# Altium schematic symbol library Regulator_Linear.SchLib: 1452 symbols (part 7 of 10) (continued)
## MIC5366-3.3YC5
designator *  value MIC5366-3.3YC5
ki_keywords: Micrel LDO voltage regulator; ki_description: 150mA Low-dropout Voltage Regulator, Vout 3.3V, Output discharge circuit, Vin up to 5.5V, SC-70-5; ki_fp_filters: SOT*353*SC*70*; Footprint: Package_TO_SOT_SMD:SOT-353_SC-70-5; Supplier: http://ww1.microchip.com/downloads/en/DeviceDoc/mic5365.pdf
footprint SOT-353_SC-70-5
pins: 1 VIN (power), 2 GND (power), 3 EN (in), 4 NC (in) hidden, 5 VOUT (power)

## MIC5501-3.0YM5
designator *  value MIC5501-3.0YM5
ki_keywords: Micrel LDO voltage regulator; ki_description: 300mA Low-dropout Voltage Regulator, Vout 3.0V, Vin up to 5.5V, SOT-23; ki_fp_filters: SOT?23?5*; Footprint: Package_TO_SOT_SMD:SOT-23-5; Supplier: http://ww1.microchip.com/downloads/en/DeviceDoc/MIC550X.pdf
footprint SOT-23-5
pins: 1 VIN (power), 2 GND (power), 3 EN (in), 4 NC (in) hidden, 5 VOUT (power)

## MIC5504-1.2YM5
designator *  value MIC5504-1.2YM5
ki_keywords: Micrel LDO voltage regulator; ki_description: 300mA Low-dropout Voltage Regulator, Vout 1.2V, Vin up to 5.5V, SOT-23; ki_fp_filters: SOT?23?5*; Footprint: Package_TO_SOT_SMD:SOT-23-5; Supplier: http://ww1.microchip.com/downloads/en/DeviceDoc/MIC550X.pdf
footprint SOT-23-5
pins: 1 VIN (power), 2 GND (power), 3 EN (in), 4 NC (in) hidden, 5 VOUT (power)

## MIC5504-1.8YM5
designator *  value MIC5504-1.8YM5
ki_keywords: Micrel LDO voltage regulator; ki_description: 300mA Low-dropout Voltage Regulator, Vout 1.8V, Vin up to 5.5V, SOT-23; ki_fp_filters: SOT?23?5*; Footprint: Package_TO_SOT_SMD:SOT-23-5; Supplier: http://ww1.microchip.com/downloads/en/DeviceDoc/MIC550X.pdf
footprint SOT-23-5
pins: 1 VIN (power), 2 GND (power), 3 EN (in), 4 NC (in) hidden, 5 VOUT (power)

## MIC5504-2.5YM5
designator *  value MIC5504-2.5YM5
ki_keywords: Micrel LDO voltage regulator; ki_description: 300mA Low-dropout Voltage Regulator, Vout 2.5V, Vin up to 5.5V, SOT-23; ki_fp_filters: SOT?23?5*; Footprint: Package_TO_SOT_SMD:SOT-23-5; Supplier: http://ww1.microchip.com/downloads/en/DeviceDoc/MIC550X.pdf
footprint SOT-23-5
pins: 1 VIN (power), 2 GND (power), 3 EN (in), 4 NC (in) hidden, 5 VOUT (power)

## MIC5504-2.8YM5
designator *  value MIC5504-2.8YM5
ki_keywords: Micrel LDO voltage regulator; ki_description: 300mA Low-dropout Voltage Regulator, Vout 2.8V, Vin up to 5.5V, SOT-23; ki_fp_filters: SOT?23?5*; Footprint: Package_TO_SOT_SMD:SOT-23-5; Supplier: http://ww1.microchip.com/downloads/en/DeviceDoc/MIC550X.pdf
footprint SOT-23-5
pins: 1 VIN (power), 2 GND (power), 3 EN (in), 4 NC (in) hidden, 5 VOUT (power)

## MIC5504-3.3YM5
designator *  value MIC5504-3.3YM5
ki_keywords: Micrel LDO voltage regulator; ki_description: 300mA Low-dropout Voltage Regulator, Vout 3.3V, Vin up to 5.5V, SOT-23; ki_fp_filters: SOT?23?5*; Footprint: Package_TO_SOT_SMD:SOT-23-5; Supplier: http://ww1.microchip.com/downloads/en/DeviceDoc/MIC550X.pdf
footprint SOT-23-5
pins: 1 VIN (power), 2 GND (power), 3 EN (in), 4 NC (in) hidden, 5 VOUT (power)

## MIC29152WT
designator *  value MIC29152WT
ki_keywords: 1.5A LDO linear voltage regulator adjustable positive; ki_description: 1.5A low dropout linear regulator, adjustable output, TO-220; ki_fp_filters: TO*220*; Footprint: Package_TO_SOT_THT:TO-220-5_P3.4x3.7mm_StaggerEven_Lead3.8mm_Vertical; Supplier: http://ww1.microchip.com/downloads/en/devicedoc/20005685a.pdf
footprint TO-220-5_P3.4x3.7mm_StaggerEven_Lead3.8mm_Vertical
pins: 1 EN (in), 2 VIN (power), 3 GND (power), 4 VOUT (power), 5 ADJ (in)

## MIC29152WU
designator *  value MIC29152WU
ki_keywords: 1.5A LDO linear voltage regulator adjustable positive; ki_description: 1.5A low dropout linear regulator, adjustable output, TO-252; ki_fp_filters: TO*252*; Footprint: Package_TO_SOT_SMD:TO-252-5_TabPin3; Supplier: http://ww1.microchip.com/downloads/en/devicedoc/20005685a.pdf
footprint TO-252-5_TabPin3
pins: 1 EN (in), 2 VIN (power), 3 GND (power), 4 VOUT (power), 5 ADJ (in)

## MIC29153WT
designator *  value MIC29153WT
ki_keywords: 1.5A LDO linear voltage regulator adjustable positive; ki_description: 1.5A low dropout linear regulator, adjustable output, TO-220; ki_fp_filters: TO*220*; Footprint: Package_TO_SOT_THT:TO-220-5_P3.4x3.7mm_StaggerEven_Lead3.8mm_Vertical; Supplier: http://ww1.microchip.com/downloads/en/devicedoc/20005685a.pdf
footprint TO-220-5_P3.4x3.7mm_StaggerEven_Lead3.8mm_Vertical
pins: 1 FLG (oc), 2 VIN (power), 3 GND (power), 4 VOUT (power), 5 ADJ (in)

## MIC29153WU
designator *  value MIC29153WU
ki_keywords: 1.5A LDO linear voltage regulator adjustable positive; ki_description: 1.5A low dropout linear regulator, adjustable output, TO-263; ki_fp_filters: TO*263*; Footprint: Package_TO_SOT_SMD:TO-263-5_TabPin3; Supplier: http://ww1.microchip.com/downloads/en/devicedoc/20005685a.pdf
footprint TO-263-5_TabPin3
pins: 1 FLG (oc), 2 VIN (power), 3 GND (power), 4 VOUT (power), 5 ADJ (in)

## MIC29302WT
designator *  value MIC29302WT
ki_keywords: 3A LDO linear voltage regulator adjustable positive; ki_description: 3A low dropout linear regulator, adjustable output, TO-220; ki_fp_filters: TO*220*; Footprint: Package_TO_SOT_THT:TO-220-5_P3.4x3.7mm_StaggerEven_Lead3.8mm_Vertical; Supplier: http://ww1.microchip.com/downloads/en/devicedoc/20005685a.pdf
footprint TO-220-5_P3.4x3.7mm_StaggerEven_Lead3.8mm_Vertical
pins: 1 EN (in), 2 VIN (power), 3 GND (power), 4 VOUT (power), 5 ADJ (in)

## MIC29302WU
designator *  value MIC29302WU
ki_keywords: 3A LDO linear voltage regulator adjustable positive; ki_description: 3A low dropout linear regulator, adjustable output, TO-263; ki_fp_filters: TO*263*; Footprint: Package_TO_SOT_SMD:TO-263-5_TabPin3; Supplier: http://ww1.microchip.com/downloads/en/devicedoc/20005685a.pdf
footprint TO-263-5_TabPin3
pins: 1 EN (in), 2 VIN (power), 3 GND (power), 4 VOUT (power), 5 ADJ (in)

## MIC29303WT
designator *  value MIC29303WT
ki_keywords: 3A LDO linear voltage regulator adjustable positive; ki_description: 3A low dropout linear regulator, adjustable output, TO-220; ki_fp_filters: TO*220*; Footprint: Package_TO_SOT_THT:TO-220-5_P3.4x3.7mm_StaggerEven_Lead3.8mm_Vertical; Supplier: http://ww1.microchip.com/downloads/en/devicedoc/20005685a.pdf
footprint TO-220-5_P3.4x3.7mm_StaggerEven_Lead3.8mm_Vertical
pins: 1 FLG (oc), 2 VIN (power), 3 GND (power), 4 VOUT (power), 5 ADJ (in)

## MIC29303WU
designator *  value MIC29303WU
ki_keywords: 3A LDO linear voltage regulator adjustable positive; ki_description: 3A low dropout linear regulator, adjustable output, TO-263; ki_fp_filters: TO*263*; Footprint: Package_TO_SOT_SMD:TO-263-5_TabPin3; Supplier: http://ww1.microchip.com/downloads/en/devicedoc/20005685a.pdf
footprint TO-263-5_TabPin3
pins: 1 FLG (oc), 2 VIN (power), 3 GND (power), 4 VOUT (power), 5 ADJ (in)

## MIC29502WT
designator *  value MIC29502WT
ki_keywords: 5A LDO linear voltage regulator adjustable positive; ki_description: 5A low dropout linear regulator, adjustable output, TO-220; ki_fp_filters: TO*220*; Footprint: Package_TO_SOT_THT:TO-220-5_P3.4x3.7mm_StaggerEven_Lead3.8mm_Vertical; Supplier: http://ww1.microchip.com/downloads/en/devicedoc/20005685a.pdf
footprint TO-220-5_P3.4x3.7mm_StaggerEven_Lead3.8mm_Vertical
pins: 1 EN (in), 2 VIN (power), 3 GND (power), 4 VOUT (power), 5 ADJ (in)

## MIC29502WU
designator *  value MIC29502WU
ki_keywords: 5A LDO linear voltage regulator adjustable positive; ki_description: 5A low dropout linear regulator, adjustable output, TO-263; ki_fp_filters: TO*263*; Footprint: Package_TO_SOT_SMD:TO-263-5_TabPin3; Supplier: http://ww1.microchip.com/downloads/en/devicedoc/20005685a.pdf
footprint TO-263-5_TabPin3
pins: 1 EN (in), 2 VIN (power), 3 GND (power), 4 VOUT (power), 5 ADJ (in)

## MIC29503WT
designator *  value MIC29503WT
ki_keywords: 5A LDO linear voltage regulator adjustable positive; ki_description: 5A low dropout linear regulator, adjustable output, TO-220; ki_fp_filters: TO*220*; Footprint: Package_TO_SOT_THT:TO-220-5_P3.4x3.7mm_StaggerEven_Lead3.8mm_Vertical; Supplier: http://ww1.microchip.com/downloads/en/devicedoc/20005685a.pdf
footprint TO-220-5_P3.4x3.7mm_StaggerEven_Lead3.8mm_Vertical
pins: 1 FLG (oc), 2 VIN (power), 3 GND (power), 4 VOUT (power), 5 ADJ (in)

## MIC29503WU
designator *  value MIC29503WU
ki_keywords: 5A LDO linear voltage regulator adjustable positive; ki_description: 5A low dropout linear regulator, adjustable output, TO-263; ki_fp_filters: TO*263*; Footprint: Package_TO_SOT_SMD:TO-263-5_TabPin3; Supplier: http://ww1.microchip.com/downloads/en/devicedoc/20005685a.pdf
footprint TO-263-5_TabPin3
pins: 1 FLG (oc), 2 VIN (power), 3 GND (power), 4 VOUT (power), 5 ADJ (in)

## MIC29752WT
designator *  value MIC29752WT
ki_keywords: 7.5A LDO linear voltage regulator adjustable positive; ki_description: 7.5A low dropout linear regulator, adjustable output, TO-247; ki_fp_filters: TO*247*; Footprint: Package_TO_SOT_THT:TO-247-5_Vertical; Supplier: http://ww1.microchip.com/downloads/en/devicedoc/20005685a.pdf
footprint TO-247-5_Vertical
pins: 1 EN (in), 2 VIN (power), 3 GND (power), 4 VOUT (power), 5 ADJ (in)

## NCP115AMX120TCG
designator *  value NCP115AMX120TCG
ki_keywords: Single Output LDO; ki_description: 300mA Low-Dropout Linear Regulators, 1.2V output voltage, LDO with low noise and enable pin, XDFN-4; ki_fp_filters: OnSemi*XDFN4*1EP*1.0x1.0mm*; Footprint: Package_DFN_QFN:OnSemi_XDFN4-1EP_1.0x1.0mm_EP0.52x0.52mm; Supplier: https://www.onsemi.com/pub/Collateral/NCP115-D.PDF
footprint OnSemi_XDFN4-1EP_1.0x1.0mm_EP0.52x0.52mm
pins: 1 OUT (power), 2 GND (power), 3 EN (in), 4 IN (power), 5 GND hidden

## NCP115AMX250TCG
designator *  value NCP115AMX250TCG
ki_keywords: Single Output LDO; ki_description: 300mA Low-Dropout Linear Regulators, 2.5V output voltage, LDO with low noise and enable pin, XDFN-4; ki_fp_filters: OnSemi*XDFN4*1EP*1.0x1.0mm*; Footprint: Package_DFN_QFN:OnSemi_XDFN4-1EP_1.0x1.0mm_EP0.52x0.52mm; Supplier: https://www.onsemi.com/pub/Collateral/NCP115-D.PDF
footprint OnSemi_XDFN4-1EP_1.0x1.0mm_EP0.52x0.52mm
pins: 1 OUT (power), 2 GND (power), 3 EN (in), 4 IN (power), 5 GND hidden

## NCP133AMX100TCG
designator *  value NCP133AMX100TCG
ki_keywords: Single Output LDO; ki_description: 500  mA  VLDO  equipped  with  NMOS  pass transistor  and  a  separate  bias  supply  voltage; ki_fp_filters: DFN?6?1EP*1.2x1.2mm*P0.4mm*; Supplier: http://www.onsemi.com/pub/Collateral/NCP133-D.PDF
pins: 1 OUT (power), 2 ADJ/NC, 3 EN (in), 4 BIAS (power), 5 GND (power), 6 IN (power), 7 GND hidden

## NCP163AFCS120T2G
designator *  value NCP163AFCS120T2G
ki_keywords: LDO regulator voltage; ki_description: 250mA low-noise LDO, 2.2V-5.5V input, 1.2V output, WLCSP-4; ki_fp_filters: WLCSP*; Footprint: Package_CSP:WLCSP-4_0.64x0.64mm_P0.35mm; Supplier: https://www.onsemi.com/pdf/datasheet/ncp163-d.pdf
footprint WLCSP-4_0.64x0.64mm_P0.35mm
pins: A1 VIN (power), A2 VOUT (power), B1 EN (in), B2 GND (power)

## NCP163AFCS180T2G
designator *  value NCP163AFCS180T2G
ki_keywords: LDO regulator voltage; ki_description: 250mA low-noise LDO, 2.2V-5.5V input, 1.8V output, WLCSP-4; ki_fp_filters: WLCSP*; Footprint: Package_CSP:WLCSP-4_0.64x0.64mm_P0.35mm; Supplier: https://www.onsemi.com/pdf/datasheet/ncp163-d.pdf
footprint WLCSP-4_0.64x0.64mm_P0.35mm
pins: A1 VIN (power), A2 VOUT (power), B1 EN (in), B2 GND (power)

## NCP163AFCS250T2G
designator *  value NCP163AFCS250T2G
ki_keywords: LDO regulator voltage; ki_description: 250mA low-noise LDO, 2.2V-5.5V input, 2.5V output, WLCSP-4; ki_fp_filters: WLCSP*; Footprint: Package_CSP:WLCSP-4_0.64x0.64mm_P0.35mm; Supplier: https://www.onsemi.com/pdf/datasheet/ncp163-d.pdf
footprint WLCSP-4_0.64x0.64mm_P0.35mm
pins: A1 VIN (power), A2 VOUT (power), B1 EN (in), B2 GND (power)

## NCP163AFCS260T2G
designator *  value NCP163AFCS260T2G
ki_keywords: LDO regulator voltage; ki_description: 250mA low-noise LDO, 2.2V-5.5V input, 2.6V output, WLCSP-4; ki_fp_filters: WLCSP*; Footprint: Package_CSP:WLCSP-4_0.64x0.64mm_P0.35mm; Supplier: https://www.onsemi.com/pdf/datasheet/ncp163-d.pdf
footprint WLCSP-4_0.64x0.64mm_P0.35mm
pins: A1 VIN (power), A2 VOUT (power), B1 EN (in), B2 GND (power)

## NCP163AFCS270T2G
designator *  value NCP163AFCS270T2G
ki_keywords: LDO regulator voltage; ki_description: 250mA low-noise LDO, 2.2V-5.5V input, 2.7V output, WLCSP-4; ki_fp_filters: WLCSP*; Footprint: Package_CSP:WLCSP-4_0.64x0.64mm_P0.35mm; Supplier: https://www.onsemi.com/pdf/datasheet/ncp163-d.pdf
footprint WLCSP-4_0.64x0.64mm_P0.35mm
pins: A1 VIN (power), A2 VOUT (power), B1 EN (in), B2 GND (power)

## NCP163AFCS280T2G
designator *  value NCP163AFCS280T2G
ki_keywords: LDO regulator voltage; ki_description: 250mA low-noise LDO, 2.2V-5.5V input, 2.8V output, WLCSP-4; ki_fp_filters: WLCSP*; Footprint: Package_CSP:WLCSP-4_0.64x0.64mm_P0.35mm; Supplier: https://www.onsemi.com/pdf/datasheet/ncp163-d.pdf
footprint WLCSP-4_0.64x0.64mm_P0.35mm
pins: A1 VIN (power), A2 VOUT (power), B1 EN (in), B2 GND (power)

## NCP163AFCS285T2G
designator *  value NCP163AFCS285T2G
ki_keywords: LDO regulator voltage; ki_description: 250mA low-noise LDO, 2.2V-5.5V input, 2.85V output, WLCSP-4; ki_fp_filters: WLCSP*; Footprint: Package_CSP:WLCSP-4_0.64x0.64mm_P0.35mm; Supplier: https://www.onsemi.com/pdf/datasheet/ncp163-d.pdf
footprint WLCSP-4_0.64x0.64mm_P0.35mm
pins: A1 VIN (power), A2 VOUT (power), B1 EN (in), B2 GND (power)

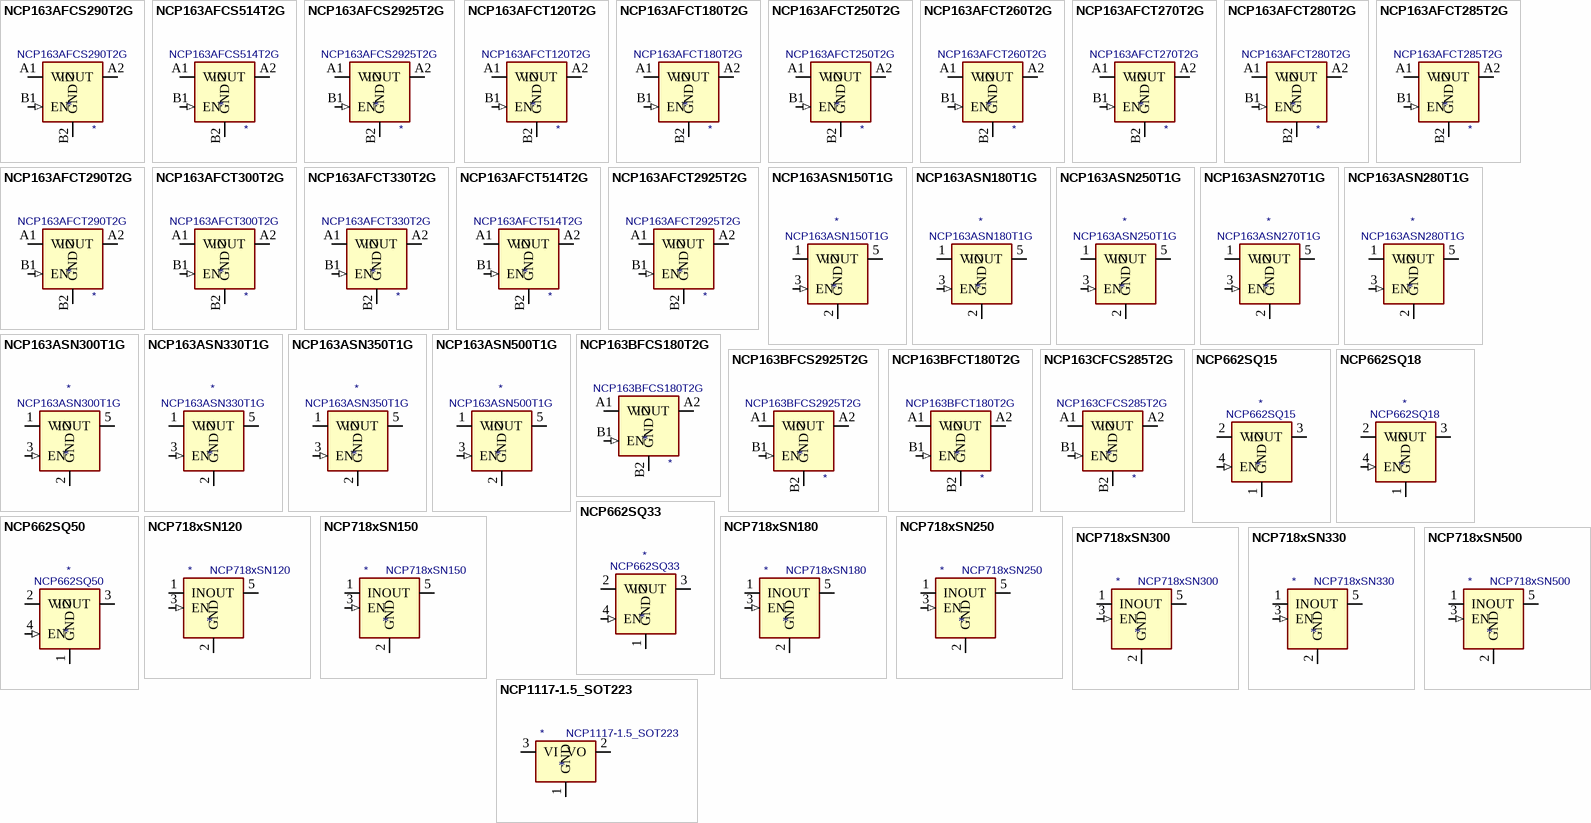
[diagram p26: symbols NCP163AFCS290T2G to NCP1117-1.5_SOT223]

## NCP163AFCS290T2G
designator *  value NCP163AFCS290T2G
ki_keywords: LDO regulator voltage; ki_description: 250mA low-noise LDO, 2.2V-5.5V input, 2.9V output, WLCSP-4; ki_fp_filters: WLCSP*; Footprint: Package_CSP:WLCSP-4_0.64x0.64mm_P0.35mm; Supplier: https://www.onsemi.com/pdf/datasheet/ncp163-d.pdf
footprint WLCSP-4_0.64x0.64mm_P0.35mm
pins: A1 VIN (power), A2 VOUT (power), B1 EN (in), B2 GND (power)

## NCP163AFCS514T2G
designator *  value NCP163AFCS514T2G
ki_keywords: LDO regulator voltage; ki_description: 250mA low-noise LDO, 2.2V-5.5V input, 5.14V output, WLCSP-4; ki_fp_filters: WLCSP*; Footprint: Package_CSP:WLCSP-4_0.64x0.64mm_P0.35mm; Supplier: https://www.onsemi.com/pdf/datasheet/ncp163-d.pdf
footprint WLCSP-4_0.64x0.64mm_P0.35mm
pins: A1 VIN (power), A2 VOUT (power), B1 EN (in), B2 GND (power)

## NCP163AFCS2925T2G
designator *  value NCP163AFCS2925T2G
ki_keywords: LDO regulator voltage; ki_description: 250mA low-noise LDO, 2.2V-5.5V input, 2.925V output, WLCSP-4; ki_fp_filters: WLCSP*; Footprint: Package_CSP:WLCSP-4_0.64x0.64mm_P0.35mm; Supplier: https://www.onsemi.com/pdf/datasheet/ncp163-d.pdf
footprint WLCSP-4_0.64x0.64mm_P0.35mm
pins: A1 VIN (power), A2 VOUT (power), B1 EN (in), B2 GND (power)

## NCP163AFCT120T2G
designator *  value NCP163AFCT120T2G
ki_keywords: LDO regulator voltage; ki_description: 250mA low-noise LDO, 2.2V-5.5V input, 1.2V output, WLCSP-4; ki_fp_filters: WLCSP*; Footprint: Package_CSP:WLCSP-4_0.64x0.64mm_P0.35mm; Supplier: https://www.onsemi.com/pdf/datasheet/ncp163-d.pdf
footprint WLCSP-4_0.64x0.64mm_P0.35mm
pins: A1 VIN (power), A2 VOUT (power), B1 EN (in), B2 GND (power)

## NCP163AFCT180T2G
designator *  value NCP163AFCT180T2G
ki_keywords: LDO regulator voltage; ki_description: 250mA low-noise LDO, 2.2V-5.5V input, 1.8V output, WLCSP-4; ki_fp_filters: WLCSP*; Footprint: Package_CSP:WLCSP-4_0.64x0.64mm_P0.35mm; Supplier: https://www.onsemi.com/pdf/datasheet/ncp163-d.pdf
footprint WLCSP-4_0.64x0.64mm_P0.35mm
pins: A1 VIN (power), A2 VOUT (power), B1 EN (in), B2 GND (power)

## NCP163AFCT250T2G
designator *  value NCP163AFCT250T2G
ki_keywords: LDO regulator voltage; ki_description: 250mA low-noise LDO, 2.2V-5.5V input, 2.5V output, WLCSP-4; ki_fp_filters: WLCSP*; Footprint: Package_CSP:WLCSP-4_0.64x0.64mm_P0.35mm; Supplier: https://www.onsemi.com/pdf/datasheet/ncp163-d.pdf
footprint WLCSP-4_0.64x0.64mm_P0.35mm
pins: A1 VIN (power), A2 VOUT (power), B1 EN (in), B2 GND (power)

## NCP163AFCT260T2G
designator *  value NCP163AFCT260T2G
ki_keywords: LDO regulator voltage; ki_description: 250mA low-noise LDO, 2.2V-5.5V input, 2.6V output, WLCSP-4; ki_fp_filters: WLCSP*; Footprint: Package_CSP:WLCSP-4_0.64x0.64mm_P0.35mm; Supplier: https://www.onsemi.com/pdf/datasheet/ncp163-d.pdf
footprint WLCSP-4_0.64x0.64mm_P0.35mm
pins: A1 VIN (power), A2 VOUT (power), B1 EN (in), B2 GND (power)

## NCP163AFCT270T2G
designator *  value NCP163AFCT270T2G
ki_keywords: LDO regulator voltage; ki_description: 250mA low-noise LDO, 2.2V-5.5V input, 2.7V output, WLCSP-4; ki_fp_filters: WLCSP*; Footprint: Package_CSP:WLCSP-4_0.64x0.64mm_P0.35mm; Supplier: https://www.onsemi.com/pdf/datasheet/ncp163-d.pdf
footprint WLCSP-4_0.64x0.64mm_P0.35mm
pins: A1 VIN (power), A2 VOUT (power), B1 EN (in), B2 GND (power)

## NCP163AFCT280T2G
designator *  value NCP163AFCT280T2G
ki_keywords: LDO regulator voltage; ki_description: 250mA low-noise LDO, 2.2V-5.5V input, 2.8V output, WLCSP-4; ki_fp_filters: WLCSP*; Footprint: Package_CSP:WLCSP-4_0.64x0.64mm_P0.35mm; Supplier: https://www.onsemi.com/pdf/datasheet/ncp163-d.pdf
footprint WLCSP-4_0.64x0.64mm_P0.35mm
pins: A1 VIN (power), A2 VOUT (power), B1 EN (in), B2 GND (power)

## NCP163AFCT285T2G
designator *  value NCP163AFCT285T2G
ki_keywords: LDO regulator voltage; ki_description: 250mA low-noise LDO, 2.2V-5.5V input, 2.85V output, WLCSP-4; ki_fp_filters: WLCSP*; Footprint: Package_CSP:WLCSP-4_0.64x0.64mm_P0.35mm; Supplier: https://www.onsemi.com/pdf/datasheet/ncp163-d.pdf
footprint WLCSP-4_0.64x0.64mm_P0.35mm
pins: A1 VIN (power), A2 VOUT (power), B1 EN (in), B2 GND (power)

## NCP163AFCT290T2G
designator *  value NCP163AFCT290T2G
ki_keywords: LDO regulator voltage; ki_description: 250mA low-noise LDO, 2.2V-5.5V input, 2.9V output, WLCSP-4; ki_fp_filters: WLCSP*; Footprint: Package_CSP:WLCSP-4_0.64x0.64mm_P0.35mm; Supplier: https://www.onsemi.com/pdf/datasheet/ncp163-d.pdf
footprint WLCSP-4_0.64x0.64mm_P0.35mm
pins: A1 VIN (power), A2 VOUT (power), B1 EN (in), B2 GND (power)

## NCP163AFCT300T2G
designator *  value NCP163AFCT300T2G
ki_keywords: LDO regulator voltage; ki_description: 250mA low-noise LDO, 2.2V-5.5V input, 3.0V output, WLCSP-4; ki_fp_filters: WLCSP*; Footprint: Package_CSP:WLCSP-4_0.64x0.64mm_P0.35mm; Supplier: https://www.onsemi.com/pdf/datasheet/ncp163-d.pdf
footprint WLCSP-4_0.64x0.64mm_P0.35mm
pins: A1 VIN (power), A2 VOUT (power), B1 EN (in), B2 GND (power)

## NCP163AFCT330T2G
designator *  value NCP163AFCT330T2G
ki_keywords: LDO regulator voltage; ki_description: 250mA low-noise LDO, 2.2V-5.5V input, 3.3V output, WLCSP-4; ki_fp_filters: WLCSP*; Footprint: Package_CSP:WLCSP-4_0.64x0.64mm_P0.35mm; Supplier: https://www.onsemi.com/pdf/datasheet/ncp163-d.pdf
footprint WLCSP-4_0.64x0.64mm_P0.35mm
pins: A1 VIN (power), A2 VOUT (power), B1 EN (in), B2 GND (power)

## NCP163AFCT514T2G
designator *  value NCP163AFCT514T2G
ki_keywords: LDO regulator voltage; ki_description: 250mA low-noise LDO, 2.2V-5.5V input, 5.14V output, WLCSP-4; ki_fp_filters: WLCSP*; Footprint: Package_CSP:WLCSP-4_0.64x0.64mm_P0.35mm; Supplier: https://www.onsemi.com/pdf/datasheet/ncp163-d.pdf
footprint WLCSP-4_0.64x0.64mm_P0.35mm
pins: A1 VIN (power), A2 VOUT (power), B1 EN (in), B2 GND (power)

## NCP163AFCT2925T2G
designator *  value NCP163AFCT2925T2G
ki_keywords: LDO regulator voltage; ki_description: 250mA low-noise LDO, 2.2V-5.5V input, 2.925V output, WLCSP-4; ki_fp_filters: WLCSP*; Footprint: Package_CSP:WLCSP-4_0.64x0.64mm_P0.35mm; Supplier: https://www.onsemi.com/pdf/datasheet/ncp163-d.pdf
footprint WLCSP-4_0.64x0.64mm_P0.35mm
pins: A1 VIN (power), A2 VOUT (power), B1 EN (in), B2 GND (power)

## NCP163ASN150T1G
designator *  value NCP163ASN150T1G
ki_keywords: LDO regulator voltage; ki_description: 250mA low-noise LDO, 2.2V-5.5V input, 1.5V output, SOT-23-5; ki_fp_filters: SOT?23*; Footprint: Package_TO_SOT_SMD:SOT-23-5; Supplier: https://www.onsemi.com/pdf/datasheet/ncp163-d.pdf
footprint SOT-23-5
pins: 1 VIN (power), 2 GND (power), 3 EN (in), 4 NC (in) hidden, 5 VOUT (power)

## NCP163ASN180T1G
designator *  value NCP163ASN180T1G
ki_keywords: LDO regulator voltage; ki_description: 250mA low-noise LDO, 2.2V-5.5V input, 1.8V output, SOT-23-5; ki_fp_filters: SOT?23*; Footprint: Package_TO_SOT_SMD:SOT-23-5; Supplier: https://www.onsemi.com/pdf/datasheet/ncp163-d.pdf
footprint SOT-23-5
pins: 1 VIN (power), 2 GND (power), 3 EN (in), 4 NC (in) hidden, 5 VOUT (power)

## NCP163ASN250T1G
designator *  value NCP163ASN250T1G
ki_keywords: LDO regulator voltage; ki_description: 250mA low-noise LDO, 2.2V-5.5V input, 2.5V output, SOT-23-5; ki_fp_filters: SOT?23*; Footprint: Package_TO_SOT_SMD:SOT-23-5; Supplier: https://www.onsemi.com/pdf/datasheet/ncp163-d.pdf
footprint SOT-23-5
pins: 1 VIN (power), 2 GND (power), 3 EN (in), 4 NC (in) hidden, 5 VOUT (power)

## NCP163ASN270T1G
designator *  value NCP163ASN270T1G
ki_keywords: LDO regulator voltage; ki_description: 250mA low-noise LDO, 2.2V-5.5V input, 2.7V output, SOT-23-5; ki_fp_filters: SOT?23*; Footprint: Package_TO_SOT_SMD:SOT-23-5; Supplier: https://www.onsemi.com/pdf/datasheet/ncp163-d.pdf
footprint SOT-23-5
pins: 1 VIN (power), 2 GND (power), 3 EN (in), 4 NC (in) hidden, 5 VOUT (power)

## NCP163ASN280T1G
designator *  value NCP163ASN280T1G
ki_keywords: LDO regulator voltage; ki_description: 250mA low-noise LDO, 2.2V-5.5V input, 2.8V output, SOT-23-5; ki_fp_filters: SOT?23*; Footprint: Package_TO_SOT_SMD:SOT-23-5; Supplier: https://www.onsemi.com/pdf/datasheet/ncp163-d.pdf
footprint SOT-23-5
pins: 1 VIN (power), 2 GND (power), 3 EN (in), 4 NC (in) hidden, 5 VOUT (power)

## NCP163ASN300T1G
designator *  value NCP163ASN300T1G
ki_keywords: LDO regulator voltage; ki_description: 250mA low-noise LDO, 2.2V-5.5V input, 3.0V output, SOT-23-5; ki_fp_filters: SOT?23*; Footprint: Package_TO_SOT_SMD:SOT-23-5; Supplier: https://www.onsemi.com/pdf/datasheet/ncp163-d.pdf
footprint SOT-23-5
pins: 1 VIN (power), 2 GND (power), 3 EN (in), 4 NC (in) hidden, 5 VOUT (power)

## NCP163ASN330T1G
designator *  value NCP163ASN330T1G
ki_keywords: LDO regulator voltage; ki_description: 250mA low-noise LDO, 2.2V-5.5V input, 3.3V output, SOT-23-5; ki_fp_filters: SOT?23*; Footprint: Package_TO_SOT_SMD:SOT-23-5; Supplier: https://www.onsemi.com/pdf/datasheet/ncp163-d.pdf
footprint SOT-23-5
pins: 1 VIN (power), 2 GND (power), 3 EN (in), 4 NC (in) hidden, 5 VOUT (power)

## NCP163ASN350T1G
designator *  value NCP163ASN350T1G
ki_keywords: LDO regulator voltage; ki_description: 250mA low-noise LDO, 2.2V-5.5V input, 3.5V output, SOT-23-5; ki_fp_filters: SOT?23*; Footprint: Package_TO_SOT_SMD:SOT-23-5; Supplier: https://www.onsemi.com/pdf/datasheet/ncp163-d.pdf
footprint SOT-23-5
pins: 1 VIN (power), 2 GND (power), 3 EN (in), 4 NC (in) hidden, 5 VOUT (power)

## NCP163ASN500T1G
designator *  value NCP163ASN500T1G
ki_keywords: LDO regulator voltage; ki_description: 250mA low-noise LDO, 2.2V-5.5V input, 5.0V output, SOT-23-5; ki_fp_filters: SOT?23*; Footprint: Package_TO_SOT_SMD:SOT-23-5; Supplier: https://www.onsemi.com/pdf/datasheet/ncp163-d.pdf
footprint SOT-23-5
pins: 1 VIN (power), 2 GND (power), 3 EN (in), 4 NC (in) hidden, 5 VOUT (power)

## NCP163BFCS180T2G
designator *  value NCP163BFCS180T2G
ki_keywords: LDO regulator voltage; ki_description: 250mA low-noise LDO, 2.2V-5.5V input, 1.8V output, WLCSP-4; ki_fp_filters: WLCSP*; Footprint: Package_CSP:WLCSP-4_0.64x0.64mm_P0.35mm; Supplier: https://www.onsemi.com/pdf/datasheet/ncp163-d.pdf
footprint WLCSP-4_0.64x0.64mm_P0.35mm
pins: A1 VIN (power), A2 VOUT (power), B1 EN (in), B2 GND (power)

## NCP163BFCS2925T2G
designator *  value NCP163BFCS2925T2G
ki_keywords: LDO regulator voltage; ki_description: 250mA low-noise LDO, 2.2V-5.5V input, 2.925V output, WLCSP-4; ki_fp_filters: WLCSP*; Footprint: Package_CSP:WLCSP-4_0.64x0.64mm_P0.35mm; Supplier: https://www.onsemi.com/pdf/datasheet/ncp163-d.pdf
footprint WLCSP-4_0.64x0.64mm_P0.35mm
pins: A1 VIN (power), A2 VOUT (power), B1 EN (in), B2 GND (power)

## NCP163BFCT180T2G
designator *  value NCP163BFCT180T2G
ki_keywords: LDO regulator voltage; ki_description: 250mA low-noise LDO, 2.2V-5.5V input, 2.925V output, WLCSP-4; ki_fp_filters: WLCSP*; Footprint: Package_CSP:WLCSP-4_0.64x0.64mm_P0.35mm; Supplier: https://www.onsemi.com/pdf/datasheet/ncp163-d.pdf
footprint WLCSP-4_0.64x0.64mm_P0.35mm
pins: A1 VIN (power), A2 VOUT (power), B1 EN (in), B2 GND (power)

## NCP163CFCS285T2G
designator *  value NCP163CFCS285T2G
ki_keywords: LDO regulator voltage; ki_description: 250mA low-noise LDO, 2.2V-5.5V input, 2.85V output, WLCSP-4; ki_fp_filters: WLCSP*; Footprint: Package_CSP:WLCSP-4_0.64x0.64mm_P0.35mm; Supplier: https://www.onsemi.com/pdf/datasheet/ncp163-d.pdf
footprint WLCSP-4_0.64x0.64mm_P0.35mm
pins: A1 VIN (power), A2 VOUT (power), B1 EN (in), B2 GND (power)

## NCP662SQ15
designator *  value NCP662SQ15
ki_keywords: LDO regulator voltage; ki_description: 100-mA, 12V Max. Input, Ultralow-IQ LDO, 1.5V, SC-82AB; ki_fp_filters: SC?82AB*; Footprint: Package_TO_SOT_SMD:SC-82AB; Supplier: https://www.onsemi.com/pub/Collateral/NCP662-D.PDF
footprint SC-82AB
pins: 1 GND (power), 2 VIN (power), 3 VOUT (power), 4 EN (in)

## NCP662SQ18
designator *  value NCP662SQ18
ki_keywords: LDO regulator voltage; ki_description: 100-mA, 12V Max. Input, Ultralow-IQ LDO, 1.8V, SC-82AB; ki_fp_filters: SC?82AB*; Footprint: Package_TO_SOT_SMD:SC-82AB; Supplier: https://www.onsemi.com/pub/Collateral/NCP662-D.PDF
footprint SC-82AB
pins: 1 GND (power), 2 VIN (power), 3 VOUT (power), 4 EN (in)

## NCP662SQ33
designator *  value NCP662SQ33
ki_keywords: LDO regulator voltage; ki_description: 100-mA, 12V Max. Input, Ultralow-IQ LDO, 3.3V, SC-82AB; ki_fp_filters: SC?82AB*; Footprint: Package_TO_SOT_SMD:SC-82AB; Supplier: https://www.onsemi.com/pub/Collateral/NCP662-D.PDF
footprint SC-82AB
pins: 1 GND (power), 2 VIN (power), 3 VOUT (power), 4 EN (in)

## NCP662SQ50
designator *  value NCP662SQ50
ki_keywords: LDO regulator voltage; ki_description: 100-mA, 12V Max. Input, Ultralow-IQ LDO, 5.0V, SC-82AB; ki_fp_filters: SC?82AB*; Footprint: Package_TO_SOT_SMD:SC-82AB; Supplier: https://www.onsemi.com/pub/Collateral/NCP662-D.PDF
footprint SC-82AB
pins: 1 GND (power), 2 VIN (power), 3 VOUT (power), 4 EN (in)

## NCP718xSN120
designator *  value NCP718xSN120
ki_keywords: Single Output LDO Wide Input; ki_description: 300-mA, Wide Input Voltage, Low-IQ LDO, 1.2V, SOT-23; ki_fp_filters: SOT?23*; Footprint: Package_TO_SOT_SMD:SOT-23-5; Supplier: https://www.onsemi.com/pub/Collateral/NCP718-D.PDF
footprint SOT-23-5
pins: 1 IN (power), 2 GND (power), 3 EN (in), 4 NC (in) hidden, 5 OUT (power)

## NCP718xSN150
designator *  value NCP718xSN150
ki_keywords: Single Output LDO Wide Input; ki_description: 300-mA, Wide Input Voltage, Low-IQ LDO, 1.5V, SOT-23; ki_fp_filters: SOT?23*; Footprint: Package_TO_SOT_SMD:SOT-23-5; Supplier: https://www.onsemi.com/pub/Collateral/NCP718-D.PDF
footprint SOT-23-5
pins: 1 IN (power), 2 GND (power), 3 EN (in), 4 NC (in) hidden, 5 OUT (power)

## NCP718xSN180
designator *  value NCP718xSN180
ki_keywords: Single Output LDO Wide Input; ki_description: 300-mA, Wide Input Voltage, Low-IQ LDO, 1.8V, SOT-23; ki_fp_filters: SOT?23*; Footprint: Package_TO_SOT_SMD:SOT-23-5; Supplier: https://www.onsemi.com/pub/Collateral/NCP718-D.PDF
footprint SOT-23-5
pins: 1 IN (power), 2 GND (power), 3 EN (in), 4 NC (in) hidden, 5 OUT (power)

## NCP718xSN250
designator *  value NCP718xSN250
ki_keywords: Single Output LDO Wide Input; ki_description: 300-mA, Wide Input Voltage, Low-IQ LDO, 2.5V, SOT-23; ki_fp_filters: SOT?23*; Footprint: Package_TO_SOT_SMD:SOT-23-5; Supplier: https://www.onsemi.com/pub/Collateral/NCP718-D.PDF
footprint SOT-23-5
pins: 1 IN (power), 2 GND (power), 3 EN (in), 4 NC (in) hidden, 5 OUT (power)

## NCP718xSN300
designator *  value NCP718xSN300
ki_keywords: Single Output LDO Wide Input; ki_description: 300-mA, Wide Input Voltage, Low-IQ LDO, 3.0V, SOT-23; ki_fp_filters: SOT?23*; Footprint: Package_TO_SOT_SMD:SOT-23-5; Supplier: https://www.onsemi.com/pub/Collateral/NCP718-D.PDF
footprint SOT-23-5
pins: 1 IN (power), 2 GND (power), 3 EN (in), 4 NC (in) hidden, 5 OUT (power)

## NCP718xSN330
designator *  value NCP718xSN330
ki_keywords: Single Output LDO Wide Input; ki_description: 300-mA, Wide Input Voltage, Low-IQ LDO, 3.3V, SOT-23; ki_fp_filters: SOT?23*; Footprint: Package_TO_SOT_SMD:SOT-23-5; Supplier: https://www.onsemi.com/pub/Collateral/NCP718-D.PDF
footprint SOT-23-5
pins: 1 IN (power), 2 GND (power), 3 EN (in), 4 NC (in) hidden, 5 OUT (power)

## NCP718xSN500
designator *  value NCP718xSN500
ki_keywords: Single Output LDO Wide Input; ki_description: 300-mA, Wide Input Voltage, Low-IQ LDO, 5.0V, SOT-23; ki_fp_filters: SOT?23*; Footprint: Package_TO_SOT_SMD:SOT-23-5; Supplier: https://www.onsemi.com/pub/Collateral/NCP718-D.PDF
footprint SOT-23-5
pins: 1 IN (power), 2 GND (power), 3 EN (in), 4 NC (in) hidden, 5 OUT (power)

## NCP1117-1.5_SOT223
designator *  value NCP1117-1.5_SOT223
ki_keywords: REGULATOR LDO 1.5V; ki_description: 1A Low drop-out regulator, Fixed Output 1.5V, SOT-223; ki_fp_filters: SOT?223*TabPin2*; Footprint: Package_TO_SOT_SMD:SOT-223-3_TabPin2; Supplier: http://www.onsemi.com/pub_link/Collateral/NCP1117-D.PDF
footprint SOT-223-3_TabPin2
pins: 1 GND (power), 2 VO (power), 3 VI (power)

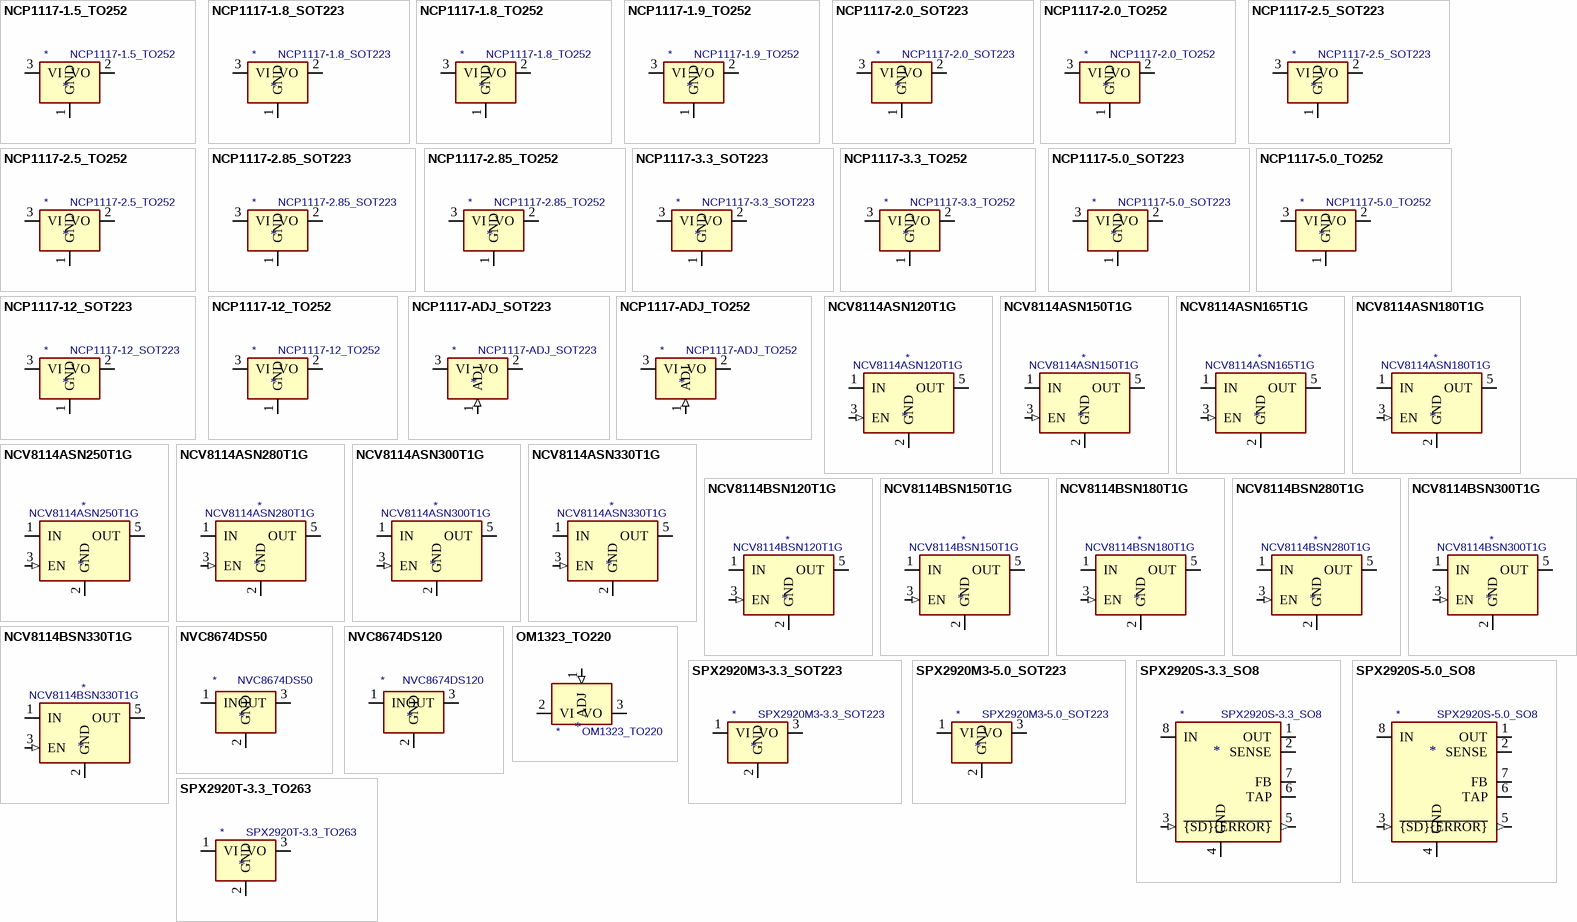
[diagram p27: symbols NCP1117-1.5_TO252 to SPX2920T-3.3_TO263]

## NCP1117-1.5_TO252
designator *  value NCP1117-1.5_TO252
ki_keywords: REGULATOR LDO 1.5V; ki_description: 1A Low drop-out regulator, Fixed Output 1.5V, TO-252 (DPAK); ki_fp_filters: TO?252*; Footprint: Package_TO_SOT_SMD:TO-252-2; Supplier: http://www.onsemi.com/pub_link/Collateral/NCP1117-D.PDF
footprint TO-252-2
pins: 1 GND (power), 2 VO (power), 3 VI (power)

## NCP1117-1.8_SOT223
designator *  value NCP1117-1.8_SOT223
ki_keywords: REGULATOR LDO 1.8V; ki_description: 1A Low drop-out regulator, Fixed Output 1.8V, SOT-223; ki_fp_filters: SOT?223*TabPin2*; Footprint: Package_TO_SOT_SMD:SOT-223-3_TabPin2; Supplier: http://www.onsemi.com/pub_link/Collateral/NCP1117-D.PDF
footprint SOT-223-3_TabPin2
pins: 1 GND (power), 2 VO (power), 3 VI (power)

## NCP1117-1.8_TO252
designator *  value NCP1117-1.8_TO252
ki_keywords: REGULATOR LDO 18.V; ki_description: 1A Low drop-out regulator, Fixed Output 1.8V, TO-252 (DPAK); ki_fp_filters: TO?252*; Footprint: Package_TO_SOT_SMD:TO-252-2; Supplier: http://www.onsemi.com/pub_link/Collateral/NCP1117-D.PDF
footprint TO-252-2
pins: 1 GND (power), 2 VO (power), 3 VI (power)

## NCP1117-1.9_TO252
designator *  value NCP1117-1.9_TO252
ki_keywords: REGULATOR LDO 1.9V; ki_description: 1A Low drop-out regulator, Fixed Output 1.9V, TO-252 (DPAK); ki_fp_filters: TO?252*; Footprint: Package_TO_SOT_SMD:TO-252-2; Supplier: http://www.onsemi.com/pub_link/Collateral/NCP1117-D.PDF
footprint TO-252-2
pins: 1 GND (power), 2 VO (power), 3 VI (power)

## NCP1117-2.0_SOT223
designator *  value NCP1117-2.0_SOT223
ki_keywords: REGULATOR LDO 2V; ki_description: 1A Low drop-out regulator, Fixed Output 2V, SOT-223; ki_fp_filters: SOT?223*TabPin2*; Footprint: Package_TO_SOT_SMD:SOT-223-3_TabPin2; Supplier: http://www.onsemi.com/pub_link/Collateral/NCP1117-D.PDF
footprint SOT-223-3_TabPin2
pins: 1 GND (power), 2 VO (power), 3 VI (power)

## NCP1117-2.0_TO252
designator *  value NCP1117-2.0_TO252
ki_keywords: REGULATOR LDO 2.0V 2V; ki_description: 1A Low drop-out regulator, Fixed Output 2.0V, TO-252 (DPAK); ki_fp_filters: TO?252*; Footprint: Package_TO_SOT_SMD:TO-252-2; Supplier: http://www.onsemi.com/pub_link/Collateral/NCP1117-D.PDF
footprint TO-252-2
pins: 1 GND (power), 2 VO (power), 3 VI (power)

## NCP1117-2.5_SOT223
designator *  value NCP1117-2.5_SOT223
ki_keywords: REGULATOR LDO 2.5V; ki_description: 1A Low drop-out regulator, Fixed Output 2.5V, SOT-223; ki_fp_filters: SOT?223*TabPin2*; Footprint: Package_TO_SOT_SMD:SOT-223-3_TabPin2; Supplier: http://www.onsemi.com/pub_link/Collateral/NCP1117-D.PDF
footprint SOT-223-3_TabPin2
pins: 1 GND (power), 2 VO (power), 3 VI (power)

## NCP1117-2.5_TO252
designator *  value NCP1117-2.5_TO252
ki_keywords: REGULATOR LDO 2.5V; ki_description: 1A Low drop-out regulator, Fixed Output 2.5V, TO-252 (DPAK); ki_fp_filters: TO?252*; Footprint: Package_TO_SOT_SMD:TO-252-2; Supplier: http://www.onsemi.com/pub_link/Collateral/NCP1117-D.PDF
footprint TO-252-2
pins: 1 GND (power), 2 VO (power), 3 VI (power)

## NCP1117-2.85_SOT223
designator *  value NCP1117-2.85_SOT223
ki_keywords: REGULATOR LDO 2.85V; ki_description: 1A Low drop-out regulator, Fixed Output 2.85V, SOT-223; ki_fp_filters: SOT?223*TabPin2*; Footprint: Package_TO_SOT_SMD:SOT-223-3_TabPin2; Supplier: http://www.onsemi.com/pub_link/Collateral/NCP1117-D.PDF
footprint SOT-223-3_TabPin2
pins: 1 GND (power), 2 VO (power), 3 VI (power)

## NCP1117-2.85_TO252
designator *  value NCP1117-2.85_TO252
ki_keywords: REGULATOR LDO 2.85V; ki_description: 1A Low drop-out regulator, Fixed Output 2.85V, TO-252 (DPAK); ki_fp_filters: TO?252*; Footprint: Package_TO_SOT_SMD:TO-252-2; Supplier: http://www.onsemi.com/pub_link/Collateral/NCP1117-D.PDF
footprint TO-252-2
pins: 1 GND (power), 2 VO (power), 3 VI (power)

## NCP1117-3.3_SOT223
designator *  value NCP1117-3.3_SOT223
ki_keywords: REGULATOR LDO 3.3V; ki_description: 1A Low drop-out regulator, Fixed Output 3.3V, SOT-223; ki_fp_filters: SOT?223*TabPin2*; Footprint: Package_TO_SOT_SMD:SOT-223-3_TabPin2; Supplier: http://www.onsemi.com/pub_link/Collateral/NCP1117-D.PDF
footprint SOT-223-3_TabPin2
pins: 1 GND (power), 2 VO (power), 3 VI (power)

## NCP1117-3.3_TO252
designator *  value NCP1117-3.3_TO252
ki_keywords: REGULATOR LDO 3.3V; ki_description: 1A Low drop-out regulator, Fixed Output 3.3V, TO-252 (DPAK); ki_fp_filters: TO?252*; Footprint: Package_TO_SOT_SMD:TO-252-2; Supplier: http://www.onsemi.com/pub_link/Collateral/NCP1117-D.PDF
footprint TO-252-2
pins: 1 GND (power), 2 VO (power), 3 VI (power)

## NCP1117-5.0_SOT223
designator *  value NCP1117-5.0_SOT223
ki_keywords: REGULATOR LDO 5V; ki_description: 1A Low drop-out regulator, Fixed Output 5V, SOT-223; ki_fp_filters: SOT?223*TabPin2*; Footprint: Package_TO_SOT_SMD:SOT-223-3_TabPin2; Supplier: http://www.onsemi.com/pub_link/Collateral/NCP1117-D.PDF
footprint SOT-223-3_TabPin2
pins: 1 GND (power), 2 VO (power), 3 VI (power)

## NCP1117-5.0_TO252
designator *  value NCP1117-5.0_TO252
ki_keywords: REGULATOR LDO 5.0V 5V; ki_description: 1A Low drop-out regulator, Fixed Output 5.0V, TO-252 (DPAK); ki_fp_filters: TO?252*; Footprint: Package_TO_SOT_SMD:TO-252-2; Supplier: http://www.onsemi.com/pub_link/Collateral/NCP1117-D.PDF
footprint TO-252-2
pins: 1 GND (power), 2 VO (power), 3 VI (power)

## NCP1117-12_SOT223
designator *  value NCP1117-12_SOT223
ki_keywords: REGULATOR LDO 12V; ki_description: 1A Low drop-out regulator, Fixed Output 12V, SOT-223; ki_fp_filters: SOT?223*TabPin2*; Footprint: Package_TO_SOT_SMD:SOT-223-3_TabPin2; Supplier: http://www.onsemi.com/pub_link/Collateral/NCP1117-D.PDF
footprint SOT-223-3_TabPin2
pins: 1 GND (power), 2 VO (power), 3 VI (power)

## NCP1117-12_TO252
designator *  value NCP1117-12_TO252
ki_keywords: REGULATOR LDO 12V; ki_description: 1A Low drop-out regulator, Fixed Output 12V, TO-252 (DPAK); ki_fp_filters: TO?252*; Footprint: Package_TO_SOT_SMD:TO-252-2; Supplier: http://www.onsemi.com/pub_link/Collateral/NCP1117-D.PDF
footprint TO-252-2
pins: 1 GND (power), 2 VO (power), 3 VI (power)

## NCP1117-ADJ_SOT223
designator *  value NCP1117-ADJ_SOT223
ki_keywords: REGULATOR LDO 12V; ki_description: 1A Low drop-out regulator, Adjustable Output 1.25 - 18.8V, SOT-223; ki_fp_filters: SOT?223*TabPin2*; Footprint: Package_TO_SOT_SMD:SOT-223-3_TabPin2; Supplier: http://www.onsemi.com/pub_link/Collateral/NCP1117-D.PDF
footprint SOT-223-3_TabPin2
pins: 1 ADJ (in), 2 VO (power), 3 VI (power)

## NCP1117-ADJ_TO252
designator *  value NCP1117-ADJ_TO252
ki_keywords: REGULATOR LDO ADJUSTABLE; ki_description: 1A Low drop-out regulator, Adjustable Output 1.25 - 18.8V, TO-252 (DPAK); ki_fp_filters: TO?252*; Footprint: Package_TO_SOT_SMD:TO-252-2; Supplier: http://www.onsemi.com/pub_link/Collateral/NCP1117-D.PDF
footprint TO-252-2
pins: 1 ADJ (in), 2 VO (power), 3 VI (power)

## NCV8114ASN120T1G
designator *  value NCV8114ASN120T1G
ki_keywords: linear regulator ldo fixed positive; ki_description: 300mA, Low Noise, Linear Regulator with output active discharge function, 1.7-5.5V input voltage range, 1.2V fixed positive output, TSOT-23-5; ki_fp_filters: TSOT?23*; Footprint: Package_TO_SOT_SMD:TSOT-23-5; Supplier: https://ru.mouser.com/datasheet/2/308/NCV8114-D-1107616.pdf
footprint TSOT-23-5
pins: 1 IN (power), 2 GND (power), 3 EN (in), 4 NC (in) hidden, 5 OUT (power)